# Altium footprint library Connectors THD.PcbLib: 631 footprints (part 20 of 46)
Each footprint in its own frame and in the unit in brackets; x right, y up, seen from the top. Pads: shape width x height; smd on the part's side, far side on the other; paste and mask are expansions set on the pad; w line width, h text height; cw(c..) or ccw(c..) is an arc to the next point about the centre after c.
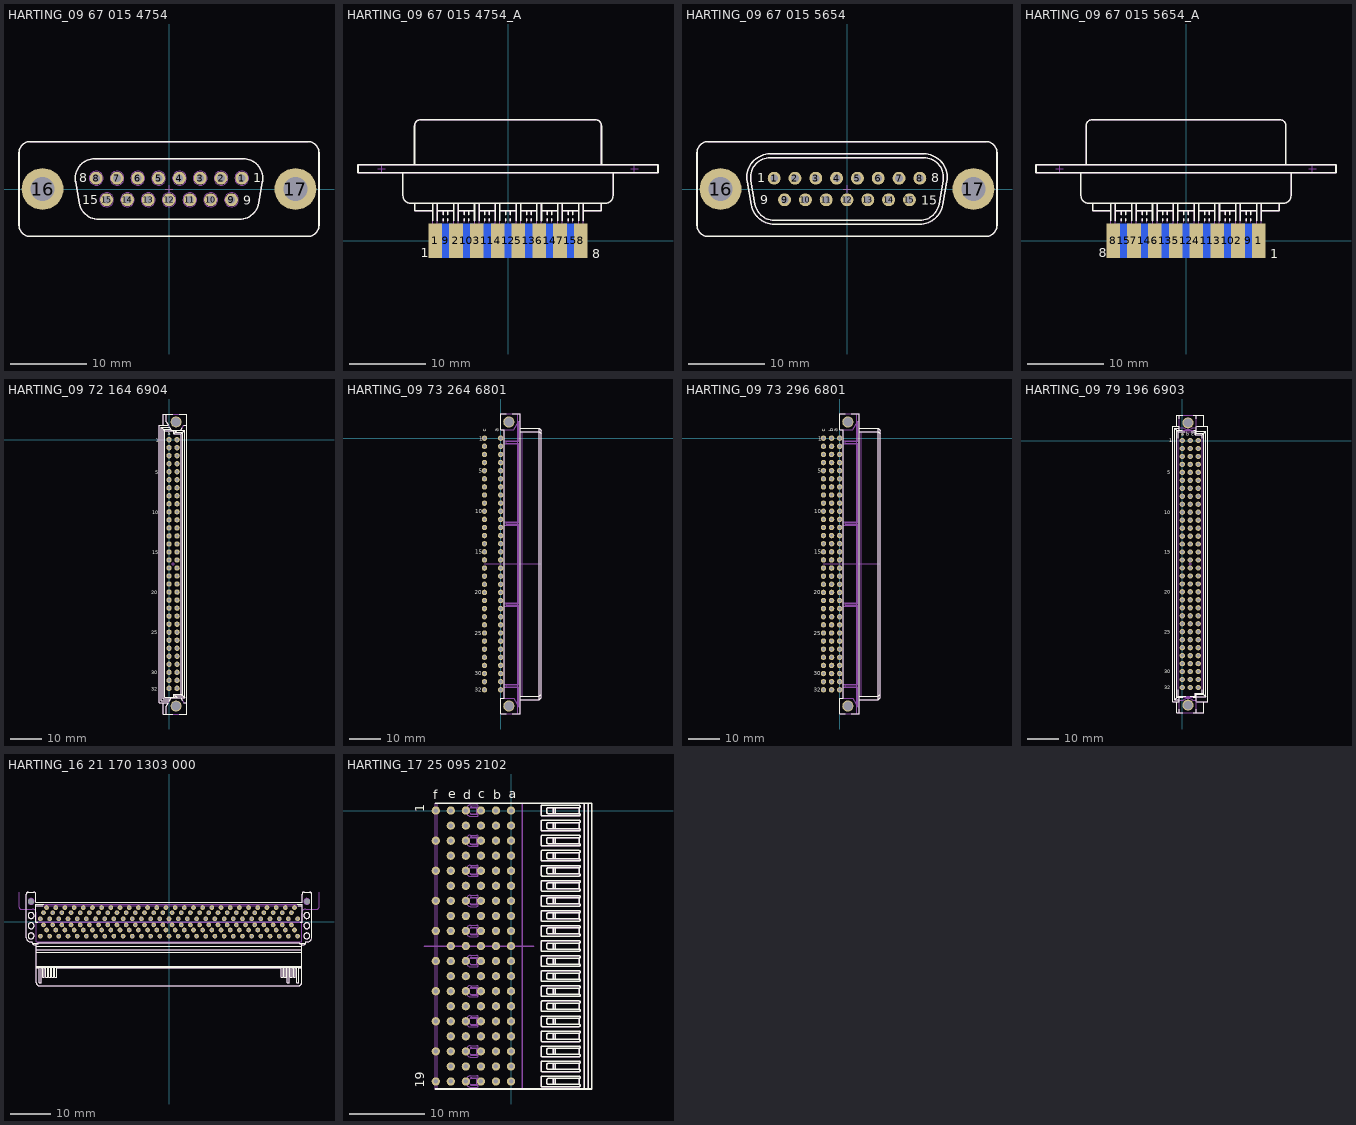
[diagram p19: the footprints below, top view; thin cyan lines are the x and y axes]

## HARTING_09 67 015 4754 [mm] "Straight D-SUB 15 Female Contacts"
height 12
pads (17):
  round 1.7 hole 1: 1(9.59,1.42) 2(6.85,1.42) 3(4.11,1.42) 4(1.37,1.42) 5(-1.37,1.42) 6(-4.11,1.42) 7(-6.85,1.42) 8(-9.59,1.42) 9(8.22,-1.42) 10(5.48,-1.42) 11(2.74,-1.42) 12(0,-1.42) 13(-2.74,-1.42) 14(-5.48,-1.42) 15(-8.22,-1.42)
  round 5.5 hole 3.2: 16(-16.65,0) 17(16.65,0)
Top Overlay:
  lines w0.2: -19.75,-4.75 ccw(c-18.25,-4.75) -18.25,-6.25 18.25,-6.25 ccw(c18.25,-4.75) 19.75,-4.75 19.75,4.75 ccw(c18.25,4.75) 18.25,6.25 -18.25,6.25 ccw(c-18.25,4.75) -19.75,4.75 -19.75,-4.75 ; -12.311,0.949 cw(c-9.75,1.4) -9.75,4 9.75,4 cw(c9.75,1.4) 12.311,0.949 11.817,-1.851 cw(c9.256,-1.4) 9.256,-4 -9.256,-4 cw(c-9.256,-1.4) -11.817,-1.851 -12.311,0.949
  text "9" at 9.8,-2.1 h1.2
  text "1" at 11.085,0.873 h1.2
  text "8" at -11.8,0.9 h1.2
  text "15" at -11.4,-2 h1.2
Mechanical 8:
  lines w0.1: -17.15,0 -16.65,0 ; -16.65,-0.5 -16.65,0 ; -16.65,0.5 -16.65,0 ; -16.15,0 -16.65,0 ; -10.09,1.42 -9.59,1.42 ; -9.59,0.92 -9.59,1.42 ; -9.59,1.92 -9.59,1.42 ; -9.09,1.42 -9.59,1.42 ; -8.72,-1.42 -8.22,-1.42 ; -8.22,-1.92 -8.22,-1.42 ; -8.22,-0.92 -8.22,-1.42 ; -7.72,-1.42 -8.22,-1.42 ; -7.35,1.42 -6.85,1.42 ; -6.85,0.92 -6.85,1.42 ; -6.85,1.92 -6.85,1.42 ; -6.35,1.42 -6.85,1.42 ; -5.98,-1.42 -5.48,-1.42 ; -5.48,-1.92 -5.48,-1.42 ; -5.48,-0.92 -5.48,-1.42 ; -4.98,-1.42 -5.48,-1.42 ; -4.61,1.42 -4.11,1.42 ; -4.11,0.92 -4.11,1.42 ; -4.11,1.92 -4.11,1.42 ; -3.61,1.42 -4.11,1.42 ; -3.24,-1.42 -2.74,-1.42 ; -2.74,-1.92 -2.74,-1.42 ; -2.74,-0.92 -2.74,-1.42 ; -2.24,-1.42 -2.74,-1.42 ; -1.87,1.42 -1.37,1.42 ; -1.37,0.92 -1.37,1.42 ; -1.37,1.92 -1.37,1.42 ; -0.87,1.42 -1.37,1.42 ; -0.5,-1.42 0,-1.42 ; -0.5,0 0,0 ; 0,-1.92 0,-1.42 ; 0,-0.92 0,-1.42 ; 0,-0.5 0,0 ; 0,0.5 0,0 ; 0.5,-1.42 0,-1.42 ; 0.5,0 0,0 ; 0.87,1.42 1.37,1.42 ; 1.37,0.92 1.37,1.42 ; 1.37,1.92 1.37,1.42 ; 1.87,1.42 1.37,1.42 ; 2.24,-1.42 2.74,-1.42 ; 2.74,-1.92 2.74,-1.42 ; 2.74,-0.92 2.74,-1.42 ; 3.24,-1.42 2.74,-1.42 ; 3.61,1.42 4.11,1.42 ; 4.11,0.92 4.11,1.42 ; 4.11,1.92 4.11,1.42 ; 4.61,1.42 4.11,1.42 ; 4.98,-1.42 5.48,-1.42 ; 5.48,-1.92 5.48,-1.42 ; 5.48,-0.92 5.48,-1.42 ; 5.98,-1.42 5.48,-1.42 ; 6.35,1.42 6.85,1.42 ; 6.85,0.92 6.85,1.42 ; 6.85,1.92 6.85,1.42 ; 7.35,1.42 6.85,1.42 ; 7.72,-1.42 8.22,-1.42 ; 8.22,-1.92 8.22,-1.42 ; 8.22,-0.92 8.22,-1.42 ; 8.72,-1.42 8.22,-1.42 ; 9.09,1.42 9.59,1.42 ; 9.59,0.92 9.59,1.42 ; 9.59,1.92 9.59,1.42 ; 10.09,1.42 9.59,1.42 ; 16.15,0 16.65,0 ; 16.65,-0.5 16.65,0 ; 16.65,0.5 16.65,0 ; 17.15,0 16.65,0
Mechanical 14:
  circle w0.1: c-9.59,1.42 r0.92
  circle w0.1: c-6.85,1.42 r0.92
  circle w0.1: c-4.11,1.42 r0.92
  circle w0.1: c-1.37,1.42 r0.92
  circle w0.1: c1.37,1.42 r0.92
  circle w0.1: c4.11,1.42 r0.92
  circle w0.1: c6.85,1.42 r0.92
  circle w0.1: c9.59,1.42 r0.92
  circle w0.1: c8.22,-1.42 r0.92
  circle w0.1: c5.48,-1.42 r0.92
  circle w0.1: c2.74,-1.42 r0.92
  circle w0.1: c0,-1.42 r0.92
  circle w0.1: c-2.74,-1.42 r0.92
  circle w0.1: c-5.48,-1.42 r0.92
  circle w0.1: c-8.22,-1.42 r0.92
  circle w0.1: c-16.65,0 r1.55
  circle w0.1: c16.65,0 r1.55
  circle w0.1: c-9.59,1.42 r0.55
  circle w0.1: c-6.85,1.42 r0.55
  circle w0.1: c-4.11,1.42 r0.55
  circle w0.1: c-1.37,1.42 r0.55
  circle w0.1: c1.37,1.42 r0.55
  circle w0.1: c4.11,1.42 r0.55
  circle w0.1: c6.85,1.42 r0.55
  circle w0.1: c9.59,1.42 r0.55
  circle w0.1: c8.22,-1.42 r0.55
  circle w0.1: c5.48,-1.42 r0.55
  circle w0.1: c2.74,-1.42 r0.55
  circle w0.1: c0,-1.42 r0.55
  circle w0.1: c-2.74,-1.42 r0.55
  circle w0.1: c-5.48,-1.42 r0.55
  circle w0.1: c-8.22,-1.42 r0.55
  lines w0.1: -19.75,-4.75 ccw(c-18.25,-4.75) -18.25,-6.25 18.25,-6.25 ccw(c18.25,-4.75) 19.75,-4.75 19.75,4.75 ccw(c18.25,4.75) 18.25,6.25 -18.25,6.25 ccw(c-18.25,4.75) -19.75,4.75 -19.75,-4.75 ; -12.311,0.949 cw(c-9.75,1.4) -9.75,4 9.75,4 cw(c9.75,1.4) 12.311,0.949 11.817,-1.851 cw(c9.256,-1.4) 9.256,-4 -9.256,-4 cw(c-9.256,-1.4) -11.817,-1.851 -12.311,0.949
  text "15" at -11.4,-2 h1.2
  text "8" at -11.8,0.9 h1.2
  text "1" at 11.085,0.873 h1.2
  text "9" at 9.8,-2.1 h1.2
3D body: height 12, standoff -6, extent -19.75,-6.25 19.75,6.25

## HARTING_09 67 015 4754_A [mm] "PCB Edge Mounting Footprint For Straight D-SUB 15 Female Contacts"
height 6
pads (15):
  rect 1.8x4.5 smd paste-2.26: 1(-9.59,0) 2(-6.85,0) 3(-4.11,0) 4(-1.37,0) 5(1.37,0) 6(4.11,0) 7(6.85,0) 8(9.59,0)
  rect 1.8x4.5 smd far side paste-2.26: 9(-8.22,0) 10(-5.48,0) 11(-2.74,0) 12(0,0) 13(2.74,0) 14(5.48,0) 15(8.22,0)
Top Overlay:
  lines w0.2: -13.833,8.928 -13.833,5.928 ccw(c-12.833,5.928) -12.833,4.928 12.833,4.928 ccw(c12.833,5.928) 13.833,5.928 13.833,8.928 ; -12.311,10.028 -12.311,15.128 cw(c-11.511,15.128) -11.511,15.928 11.511,15.928 cw(c11.511,15.128) 12.311,15.128 12.311,10.028 ; -12.3,4.928 -12.3,3.928 -9.89,3.928 ; -9.89,2.65 -9.89,4.928 ; -9.29,2.65 -9.29,4.928 ; -9.29,3.928 -7.15,3.928 ; -8.52,2.65 -8.52,2.928 ; -8.52,3.428 -8.52,3.928 ; -7.92,2.65 -7.92,2.928 ; -7.92,3.428 -7.92,3.928 ; -7.15,2.65 -7.15,4.928 ; -6.55,2.65 -6.55,4.928 ; -6.55,3.928 -4.41,3.928 ; -5.78,2.65 -5.78,2.928 ; -5.78,3.428 -5.78,3.928 ; -5.18,2.65 -5.18,2.928 ; -5.18,3.428 -5.18,3.928 ; -4.41,2.65 -4.41,4.928 ; -3.81,2.65 -3.81,4.928 ; -3.81,3.928 -1.67,3.928 ; -3.04,2.65 -3.04,2.928 ; -3.04,3.428 -3.04,3.928 ; -2.44,2.65 -2.44,2.928 ; -2.44,3.428 -2.44,3.928 ; -1.67,2.65 -1.67,4.928 ; -1.07,2.65 -1.07,4.928 ; -1.07,3.928 1.07,3.928 ; -0.3,2.65 -0.3,2.928 ; -0.3,3.428 -0.3,3.928 ; 0.3,2.65 0.3,2.928 ; 0.3,3.428 0.3,3.928 ; 1.07,2.65 1.07,4.928 ; 1.67,2.65 1.67,4.928 ; 1.67,3.928 3.81,3.928 ; 2.44,2.65 2.44,2.928 ; 2.44,3.428 2.44,3.928 ; 3.04,2.65 3.04,2.928 ; 3.04,3.428 3.04,3.928 ; 3.81,2.65 3.81,4.928 ; 4.41,2.65 4.41,4.928 ; 4.41,3.928 6.55,3.928 ; 5.18,2.65 5.18,2.928 ; 5.18,3.428 5.18,3.928 ; 5.78,2.65 5.78,2.928 ; 5.78,3.428 5.78,3.928 ; 6.55,2.65 6.55,4.928 ; 7.15,2.65 7.15,4.928 ; 7.15,3.928 9.29,3.928 ; 7.92,2.65 7.92,2.928 ; 7.92,3.428 7.92,3.928 ; 8.52,2.65 8.52,2.928 ; 8.52,3.428 8.52,3.928 ; 9.29,2.65 9.29,4.928 ; 9.89,2.65 9.89,4.928 ; 9.89,3.928 12.3,3.928 12.3,4.928 ; -19.75,8.928 19.75,8.928 19.75,10.028 -19.75,10.028 -19.75,8.928
  text "8" at 11.1,-2.3 h1.2
  text "1" at -11.5,-2.2 h1.2
Bottom Overlay:
  lines w0.2: -13.833,8.928 -13.833,5.928 ccw(c-12.833,5.928) -12.833,4.928 12.833,4.928 ccw(c12.833,5.928) 13.833,5.928 13.833,8.928 ; -12.311,10.028 -12.311,15.128 cw(c-11.511,15.128) -11.511,15.928 11.511,15.928 cw(c11.511,15.128) 12.311,15.128 12.311,10.028 ; -12.3,4.928 -12.3,3.928 -8.52,3.928 ; -9.89,2.65 -9.89,2.928 ; -9.89,3.428 -9.89,3.928 ; -9.29,2.65 -9.29,2.928 ; -9.29,3.428 -9.29,3.928 ; -8.52,2.65 -8.52,4.928 ; -7.92,2.65 -7.92,4.928 ; -7.92,3.928 -5.78,3.928 ; -7.15,2.65 -7.15,2.928 ; -7.15,3.428 -7.15,3.928 ; -6.55,2.65 -6.55,2.928 ; -6.55,3.428 -6.55,3.928 ; -5.78,2.65 -5.78,4.928 ; -5.18,2.65 -5.18,4.928 ; -5.18,3.928 -3.04,3.928 ; -4.41,2.65 -4.41,2.928 ; -4.41,3.428 -4.41,3.928 ; -3.81,2.65 -3.81,2.928 ; -3.81,3.428 -3.81,3.928 ; -3.04,2.65 -3.04,4.928 ; -2.44,2.65 -2.44,4.928 ; -2.44,3.928 -0.3,3.928 ; -1.67,2.65 -1.67,2.928 ; -1.67,3.428 -1.67,3.928 ; -1.07,2.65 -1.07,2.928 ; -1.07,3.428 -1.07,3.928 ; -0.3,2.65 -0.3,4.928 ; 0.3,2.65 0.3,4.928 ; 0.3,3.928 2.44,3.928 ; 1.07,2.65 1.07,2.928 ; 1.07,3.428 1.07,3.928 ; 1.67,2.65 1.67,2.928 ; 1.67,3.428 1.67,3.928 ; 2.44,2.65 2.44,4.928 ; 3.04,2.65 3.04,4.928 ; 3.04,3.928 5.18,3.928 ; 3.81,2.65 3.81,2.928 ; 3.81,3.428 3.81,3.928 ; 4.41,2.65 4.41,2.928 ; 4.41,3.428 4.41,3.928 ; 5.18,2.65 5.18,4.928 ; 5.78,2.65 5.78,4.928 ; 5.78,3.928 7.92,3.928 ; 6.55,2.65 6.55,2.928 ; 6.55,3.428 6.55,3.928 ; 7.15,2.65 7.15,2.928 ; 7.15,3.428 7.15,3.928 ; 7.92,2.65 7.92,4.928 ; 8.52,2.65 8.52,4.928 ; 8.52,3.928 12.3,3.928 12.3,4.928 ; 9.29,2.65 9.29,2.928 ; 9.29,3.428 9.29,3.928 ; 9.89,2.65 9.89,2.928 ; 9.89,3.428 9.89,3.928 ; -19.75,8.928 19.75,8.928 19.75,10.028 -19.75,10.028 -19.75,8.928
  text "15" at 11.3,-2.2 h1.2
  text "9" at -9.6,-2.2 h1.2
Mechanical 8:
  lines w0.1: -17.15,9.478 -16.65,9.478 ; -16.65,8.928 -16.65,9.478 ; -16.65,10.028 -16.65,9.478 ; -16.15,9.478 -16.65,9.478 ; -10.09,0 -9.59,0 ; -9.59,-0.5 -9.59,0 ; -9.59,0.5 -9.59,0 ; -9.09,0 -9.59,0 ; -8.72,0 -8.22,0 ; -8.22,-0.5 -8.22,0 ; -8.22,0.5 -8.22,0 ; -7.72,0 -8.22,0 ; -7.35,0 -6.85,0 ; -6.85,-0.5 -6.85,0 ; -6.85,0.5 -6.85,0 ; -6.35,0 -6.85,0 ; -5.98,0 -5.48,0 ; -5.48,-0.5 -5.48,0 ; -5.48,0.5 -5.48,0 ; -4.98,0 -5.48,0 ; -4.61,0 -4.11,0 ; -4.11,-0.5 -4.11,0 ; -4.11,0.5 -4.11,0 ; -3.61,0 -4.11,0 ; -3.24,0 -2.74,0 ; -2.74,-0.5 -2.74,0 ; -2.74,0.5 -2.74,0 ; -2.24,0 -2.74,0 ; -1.87,0 -1.37,0 ; -1.37,-0.5 -1.37,0 ; -1.37,0.5 -1.37,0 ; -0.87,0 -1.37,0 ; -0.5,0 0,0 ; 0,-0.5 0,0 ; 0,0.5 0,0 ; 0.5,0 0,0 ; 0.87,0 1.37,0 ; 1.37,-0.5 1.37,0 ; 1.37,0.5 1.37,0 ; 1.87,0 1.37,0 ; 2.24,0 2.74,0 ; 2.74,-0.5 2.74,0 ; 2.74,0.5 2.74,0 ; 3.24,0 2.74,0 ; 3.61,0 4.11,0 ; 4.11,-0.5 4.11,0 ; 4.11,0.5 4.11,0 ; 4.61,0 4.11,0 ; 4.98,0 5.48,0 ; 5.48,-0.5 5.48,0 ; 5.48,0.5 5.48,0 ; 5.98,0 5.48,0 ; 6.35,0 6.85,0 ; 6.85,-0.5 6.85,0 ; 6.85,0.5 6.85,0 ; 7.35,0 6.85,0 ; 7.72,0 8.22,0 ; 8.22,-0.5 8.22,0 ; 8.22,0.5 8.22,0 ; 8.72,0 8.22,0 ; 9.09,0 9.59,0 ; 9.59,-0.5 9.59,0 ; 9.59,0.5 9.59,0 ; 10.09,0 9.59,0 ; 16.15,9.478 16.65,9.478 ; 16.65,8.928 16.65,9.478 ; 16.65,10.028 16.65,9.478 ; 17.15,9.478 16.65,9.478
Mechanical 14:
  drawing of 155 lines, arcs and shapes, not listed
  text "8" at 11.1,-2.3 h1.2
  text "1" at -11.5,-2.2 h1.2
3D body: height 5.45, standoff -7.05, extent -19.75,-2.072 19.75,15.928

## HARTING_09 67 015 5654 [mm] "Straight D-SUB 15 Male Contacts"
height 12
pads (17):
  round 1.7 hole 1: 1(-9.59,1.42) 2(-6.85,1.42) 3(-4.11,1.42) 4(-1.37,1.42) 5(1.37,1.42) 6(4.11,1.42) 7(6.85,1.42) 8(9.59,1.42) 9(-8.22,-1.42) 10(-5.48,-1.42) 11(-2.74,-1.42) 12(0,-1.42) 13(2.74,-1.42) 14(5.48,-1.42) 15(8.22,-1.42)
  round 5.5 hole 3.2: 16(-16.65,0) 17(16.65,0)
Top Overlay:
  lines w0.2: -19.75,-4.75 ccw(c-18.25,-4.75) -18.25,-6.25 18.25,-6.25 ccw(c18.25,-4.75) 19.75,-4.75 19.75,4.75 ccw(c18.25,4.75) 18.25,6.25 -18.25,6.25 ccw(c-18.25,4.75) -19.75,4.75 -19.75,-4.75 ; -13.153,0.987 cw(c-10.1,1.525) -10.1,4.625 10.1,4.625 cw(c10.1,1.525) 13.153,0.987 12.615,-2.063 cw(c9.562,-1.525) 9.562,-4.625 -9.562,-4.625 cw(c-9.562,-1.525) -12.615,-2.063 -13.153,0.987 ; -12.661,1.074 cw(c-10.1,1.525) -10.1,4.125 10.1,4.125 cw(c10.1,1.525) 12.661,1.074 12.123,-1.976 cw(c9.562,-1.525) 9.562,-4.125 -9.562,-4.125 cw(c-9.562,-1.525) -12.123,-1.976 -12.661,1.074
  text "15" at 9.8,-2.1 h1.2
  text "8" at 11.085,0.873 h1.2
  text "1" at -11.8,0.9 h1.2
  text "9" at -11.4,-2 h1.2
Mechanical 8:
  lines w0.1: -17.15,0 -16.65,0 ; -16.65,-0.5 -16.65,0 ; -16.65,0.5 -16.65,0 ; -16.15,0 -16.65,0 ; -10.09,1.42 -9.59,1.42 ; -9.59,0.92 -9.59,1.42 ; -9.59,1.92 -9.59,1.42 ; -9.09,1.42 -9.59,1.42 ; -8.72,-1.42 -8.22,-1.42 ; -8.22,-1.92 -8.22,-1.42 ; -8.22,-0.92 -8.22,-1.42 ; -7.72,-1.42 -8.22,-1.42 ; -7.35,1.42 -6.85,1.42 ; -6.85,0.92 -6.85,1.42 ; -6.85,1.92 -6.85,1.42 ; -6.35,1.42 -6.85,1.42 ; -5.98,-1.42 -5.48,-1.42 ; -5.48,-1.92 -5.48,-1.42 ; -5.48,-0.92 -5.48,-1.42 ; -4.98,-1.42 -5.48,-1.42 ; -4.61,1.42 -4.11,1.42 ; -4.11,0.92 -4.11,1.42 ; -4.11,1.92 -4.11,1.42 ; -3.61,1.42 -4.11,1.42 ; -3.24,-1.42 -2.74,-1.42 ; -2.74,-1.92 -2.74,-1.42 ; -2.74,-0.92 -2.74,-1.42 ; -2.24,-1.42 -2.74,-1.42 ; -1.87,1.42 -1.37,1.42 ; -1.37,0.92 -1.37,1.42 ; -1.37,1.92 -1.37,1.42 ; -0.87,1.42 -1.37,1.42 ; -0.5,-1.42 0,-1.42 ; -0.5,0 0,0 ; 0,-1.92 0,-1.42 ; 0,-0.92 0,-1.42 ; 0,-0.5 0,0 ; 0,0.5 0,0 ; 0.5,-1.42 0,-1.42 ; 0.5,0 0,0 ; 0.87,1.42 1.37,1.42 ; 1.37,0.92 1.37,1.42 ; 1.37,1.92 1.37,1.42 ; 1.87,1.42 1.37,1.42 ; 2.24,-1.42 2.74,-1.42 ; 2.74,-1.92 2.74,-1.42 ; 2.74,-0.92 2.74,-1.42 ; 3.24,-1.42 2.74,-1.42 ; 3.61,1.42 4.11,1.42 ; 4.11,0.92 4.11,1.42 ; 4.11,1.92 4.11,1.42 ; 4.61,1.42 4.11,1.42 ; 4.98,-1.42 5.48,-1.42 ; 5.48,-1.92 5.48,-1.42 ; 5.48,-0.92 5.48,-1.42 ; 5.98,-1.42 5.48,-1.42 ; 6.35,1.42 6.85,1.42 ; 6.85,0.92 6.85,1.42 ; 6.85,1.92 6.85,1.42 ; 7.35,1.42 6.85,1.42 ; 7.72,-1.42 8.22,-1.42 ; 8.22,-1.92 8.22,-1.42 ; 8.22,-0.92 8.22,-1.42 ; 8.72,-1.42 8.22,-1.42 ; 9.09,1.42 9.59,1.42 ; 9.59,0.92 9.59,1.42 ; 9.59,1.92 9.59,1.42 ; 10.09,1.42 9.59,1.42 ; 16.15,0 16.65,0 ; 16.65,-0.5 16.65,0 ; 16.65,0.5 16.65,0 ; 17.15,0 16.65,0
Mechanical 14:
  circle w0.1: c-8.22,-1.42 r0.55
  circle w0.1: c-5.48,-1.42 r0.55
  circle w0.1: c-2.74,-1.42 r0.55
  circle w0.1: c0,-1.42 r0.55
  circle w0.1: c2.74,-1.42 r0.55
  circle w0.1: c5.48,-1.42 r0.55
  circle w0.1: c8.22,-1.42 r0.55
  circle w0.1: c9.59,1.42 r0.55
  circle w0.1: c6.85,1.42 r0.55
  circle w0.1: c4.11,1.42 r0.55
  circle w0.1: c1.37,1.42 r0.55
  circle w0.1: c-1.37,1.42 r0.55
  circle w0.1: c-4.11,1.42 r0.55
  circle w0.1: c-6.85,1.42 r0.55
  circle w0.1: c-9.59,1.42 r0.55
  circle w0.1: c16.65,0 r1.55
  circle w0.1: c-16.65,0 r1.55
  lines w0.1: -19.75,-4.75 ccw(c-18.25,-4.75) -18.25,-6.25 18.25,-6.25 ccw(c18.25,-4.75) 19.75,-4.75 19.75,4.75 ccw(c18.25,4.75) 18.25,6.25 -18.25,6.25 ccw(c-18.25,4.75) -19.75,4.75 -19.75,-4.75 ; -13.153,0.987 cw(c-10.1,1.525) -10.1,4.625 10.1,4.625 cw(c10.1,1.525) 13.153,0.987 12.615,-2.063 cw(c9.562,-1.525) 9.562,-4.625 -9.562,-4.625 cw(c-9.562,-1.525) -12.615,-2.063 -13.153,0.987 ; -12.661,1.074 cw(c-10.1,1.525) -10.1,4.125 10.1,4.125 cw(c10.1,1.525) 12.661,1.074 12.123,-1.976 cw(c9.562,-1.525) 9.562,-4.125 -9.562,-4.125 cw(c-9.562,-1.525) -12.123,-1.976 -12.661,1.074
  text "9" at -11.4,-2 h1.2
  text "1" at -11.8,0.9 h1.2
  text "8" at 11.085,0.873 h1.2
  text "15" at 9.8,-2.1 h1.2
3D body: height 12, standoff -6, extent -19.75,-6.25 19.75,6.25

## HARTING_09 67 015 5654_A [mm] "PCB Edge Mounting Footprint For Straight D-SUB 15 Male Contacts"
height 6
pads (15):
  rect 1.8x4.5 smd paste-2.26: 1(9.59,0) 2(6.85,0) 3(4.11,0) 4(1.37,0) 5(-1.37,0) 6(-4.11,0) 7(-6.85,0) 8(-9.59,0)
  rect 1.8x4.5 smd far side paste-2.26: 9(8.22,0) 10(5.48,0) 11(2.74,0) 12(0,0) 13(-2.74,0) 14(-5.48,0) 15(-8.22,0)
Top Overlay:
  lines w0.2: -13.833,8.928 -13.833,5.928 ccw(c-12.833,5.928) -12.833,4.928 12.833,4.928 ccw(c12.833,5.928) 13.833,5.928 13.833,8.928 ; -13.153,10.028 -13.153,15.128 cw(c-12.353,15.128) -12.353,15.928 12.353,15.928 cw(c12.353,15.128) 13.153,15.128 13.153,10.028 ; -12.3,4.928 -12.3,3.928 -9.89,3.928 ; -9.89,2.65 -9.89,4.928 ; -9.29,2.65 -9.29,4.928 ; -9.29,3.928 -7.15,3.928 ; -8.52,2.65 -8.52,2.928 ; -8.52,3.428 -8.52,3.928 ; -7.92,2.65 -7.92,2.928 ; -7.92,3.428 -7.92,3.928 ; -7.15,2.65 -7.15,4.928 ; -6.55,2.65 -6.55,4.928 ; -6.55,3.928 -4.41,3.928 ; -5.78,2.65 -5.78,2.928 ; -5.78,3.428 -5.78,3.928 ; -5.18,2.65 -5.18,2.928 ; -5.18,3.428 -5.18,3.928 ; -4.41,2.65 -4.41,4.928 ; -3.81,2.65 -3.81,4.928 ; -3.81,3.928 -1.67,3.928 ; -3.04,2.65 -3.04,2.928 ; -3.04,3.428 -3.04,3.928 ; -2.44,2.65 -2.44,2.928 ; -2.44,3.428 -2.44,3.928 ; -1.67,2.65 -1.67,4.928 ; -1.07,2.65 -1.07,4.928 ; -1.07,3.928 1.07,3.928 ; -0.3,2.65 -0.3,2.928 ; -0.3,3.428 -0.3,3.928 ; 0.3,2.65 0.3,2.928 ; 0.3,3.428 0.3,3.928 ; 1.07,2.65 1.07,4.928 ; 1.67,2.65 1.67,4.928 ; 1.67,3.928 3.81,3.928 ; 2.44,2.65 2.44,2.928 ; 2.44,3.428 2.44,3.928 ; 3.04,2.65 3.04,2.928 ; 3.04,3.428 3.04,3.928 ; 3.81,2.65 3.81,4.928 ; 4.41,2.65 4.41,4.928 ; 4.41,3.928 6.55,3.928 ; 5.18,2.65 5.18,2.928 ; 5.18,3.428 5.18,3.928 ; 5.78,2.65 5.78,2.928 ; 5.78,3.428 5.78,3.928 ; 6.55,2.65 6.55,4.928 ; 7.15,2.65 7.15,4.928 ; 7.15,3.928 9.29,3.928 ; 7.92,2.65 7.92,2.928 ; 7.92,3.428 7.92,3.928 ; 8.52,2.65 8.52,2.928 ; 8.52,3.428 8.52,3.928 ; 9.29,2.65 9.29,4.928 ; 9.89,2.65 9.89,4.928 ; 9.89,3.928 12.3,3.928 12.3,4.928 ; -19.75,8.928 19.75,8.928 19.75,10.028 -19.75,10.028 -19.75,8.928
  text "1" at 11.1,-2.3 h1.2
  text "8" at -11.5,-2.2 h1.2
Bottom Overlay:
  lines w0.2: -13.833,8.928 -13.833,5.928 ccw(c-12.833,5.928) -12.833,4.928 12.833,4.928 ccw(c12.833,5.928) 13.833,5.928 13.833,8.928 ; -13.153,10.028 -13.153,15.128 cw(c-12.353,15.128) -12.353,15.928 12.353,15.928 cw(c12.353,15.128) 13.153,15.128 13.153,10.028 ; -12.3,4.928 -12.3,3.928 -8.52,3.928 ; -9.89,2.65 -9.89,2.928 ; -9.89,3.428 -9.89,3.928 ; -9.29,2.65 -9.29,2.928 ; -9.29,3.428 -9.29,3.928 ; -8.52,2.65 -8.52,4.928 ; -7.92,2.65 -7.92,4.928 ; -7.92,3.928 -5.78,3.928 ; -7.15,2.65 -7.15,2.928 ; -7.15,3.428 -7.15,3.928 ; -6.55,2.65 -6.55,2.928 ; -6.55,3.428 -6.55,3.928 ; -5.78,2.65 -5.78,4.928 ; -5.18,2.65 -5.18,4.928 ; -5.18,3.928 -3.04,3.928 ; -4.41,2.65 -4.41,2.928 ; -4.41,3.428 -4.41,3.928 ; -3.81,2.65 -3.81,2.928 ; -3.81,3.428 -3.81,3.928 ; -3.04,2.65 -3.04,4.928 ; -2.44,2.65 -2.44,4.928 ; -2.44,3.928 -0.3,3.928 ; -1.67,2.65 -1.67,2.928 ; -1.67,3.428 -1.67,3.928 ; -1.07,2.65 -1.07,2.928 ; -1.07,3.428 -1.07,3.928 ; -0.3,2.65 -0.3,4.928 ; 0.3,2.65 0.3,4.928 ; 0.3,3.928 2.44,3.928 ; 1.07,2.65 1.07,2.928 ; 1.07,3.428 1.07,3.928 ; 1.67,2.65 1.67,2.928 ; 1.67,3.428 1.67,3.928 ; 2.44,2.65 2.44,4.928 ; 3.04,2.65 3.04,4.928 ; 3.04,3.928 5.18,3.928 ; 3.81,2.65 3.81,2.928 ; 3.81,3.428 3.81,3.928 ; 4.41,2.65 4.41,2.928 ; 4.41,3.428 4.41,3.928 ; 5.18,2.65 5.18,4.928 ; 5.78,2.65 5.78,4.928 ; 5.78,3.928 7.92,3.928 ; 6.55,2.65 6.55,2.928 ; 6.55,3.428 6.55,3.928 ; 7.15,2.65 7.15,2.928 ; 7.15,3.428 7.15,3.928 ; 7.92,2.65 7.92,4.928 ; 8.52,2.65 8.52,4.928 ; 8.52,3.928 12.3,3.928 12.3,4.928 ; 9.29,2.65 9.29,2.928 ; 9.29,3.428 9.29,3.928 ; 9.89,2.65 9.89,2.928 ; 9.89,3.428 9.89,3.928 ; -19.75,8.928 19.75,8.928 19.75,10.028 -19.75,10.028 -19.75,8.928
  text "9" at 10.4,-2.2 h1.2
  text "15" at -9.6,-2.2 h1.2
Mechanical 8:
  lines w0.1: -17.15,9.478 -16.65,9.478 ; -16.65,8.928 -16.65,9.478 ; -16.65,10.028 -16.65,9.478 ; -16.15,9.478 -16.65,9.478 ; -10.09,0 -9.59,0 ; -9.59,-0.5 -9.59,0 ; -9.59,0.5 -9.59,0 ; -9.09,0 -9.59,0 ; -8.72,0 -8.22,0 ; -8.22,-0.5 -8.22,0 ; -8.22,0.5 -8.22,0 ; -7.72,0 -8.22,0 ; -7.35,0 -6.85,0 ; -6.85,-0.5 -6.85,0 ; -6.85,0.5 -6.85,0 ; -6.35,0 -6.85,0 ; -5.98,0 -5.48,0 ; -5.48,-0.5 -5.48,0 ; -5.48,0.5 -5.48,0 ; -4.98,0 -5.48,0 ; -4.61,0 -4.11,0 ; -4.11,-0.5 -4.11,0 ; -4.11,0.5 -4.11,0 ; -3.61,0 -4.11,0 ; -3.24,0 -2.74,0 ; -2.74,-0.5 -2.74,0 ; -2.74,0.5 -2.74,0 ; -2.24,0 -2.74,0 ; -1.87,0 -1.37,0 ; -1.37,-0.5 -1.37,0 ; -1.37,0.5 -1.37,0 ; -0.87,0 -1.37,0 ; -0.5,0 0,0 ; 0,-0.5 0,0 ; 0,0.5 0,0 ; 0.5,0 0,0 ; 0.87,0 1.37,0 ; 1.37,-0.5 1.37,0 ; 1.37,0.5 1.37,0 ; 1.87,0 1.37,0 ; 2.24,0 2.74,0 ; 2.74,-0.5 2.74,0 ; 2.74,0.5 2.74,0 ; 3.24,0 2.74,0 ; 3.61,0 4.11,0 ; 4.11,-0.5 4.11,0 ; 4.11,0.5 4.11,0 ; 4.61,0 4.11,0 ; 4.98,0 5.48,0 ; 5.48,-0.5 5.48,0 ; 5.48,0.5 5.48,0 ; 5.98,0 5.48,0 ; 6.35,0 6.85,0 ; 6.85,-0.5 6.85,0 ; 6.85,0.5 6.85,0 ; 7.35,0 6.85,0 ; 7.72,0 8.22,0 ; 8.22,-0.5 8.22,0 ; 8.22,0.5 8.22,0 ; 8.72,0 8.22,0 ; 9.09,0 9.59,0 ; 9.59,-0.5 9.59,0 ; 9.59,0.5 9.59,0 ; 10.09,0 9.59,0 ; 16.15,9.478 16.65,9.478 ; 16.65,8.928 16.65,9.478 ; 16.65,10.028 16.65,9.478 ; 17.15,9.478 16.65,9.478
Mechanical 14:
  drawing of 155 lines, arcs and shapes, not listed
  text "1" at 11.1,-2.3 h1.2
  text "8" at -11.5,-2.2 h1.2
3D body: height 5.45, standoff -7.05, extent -19.75,-2.072 19.75,15.928

## HARTING_09 72 164 6904 [mm] "DIN 41612, Type Q, Thru-Hole Press-in; Rows a+b, 64 Position, Straight Male Connector"
height 11.6
pads (66):
  round 1.7 hole 1: a1(0,0) a2(0,-2.54) a3(0,-5.08) a4(0,-7.62) a5(0,-10.16) a6(0,-12.7) a7(0,-15.24) a8(0,-17.78) a9(0,-20.32) a10(0,-22.86) a11(0,-25.4) a12(0,-27.94) a13(0,-30.48) a14(0,-33.02) a15(0,-35.56) a16(0,-38.1) a17(0,-40.64) a18(0,-43.18) a19(0,-45.72) a20(0,-48.26) a21(0,-50.8) a22(0,-53.34) a23(0,-55.88) a24(0,-58.42) a25(0,-60.96) a26(0,-63.5) a27(0,-66.04) a28(0,-68.58) a29(0,-71.12) a30(0,-73.66) a31(0,-76.2) a32(0,-78.74) b1(2.54,0) b2(2.54,-2.54) b3(2.54,-5.08) b4(2.54,-7.62) b5(2.54,-10.16) b6(2.54,-12.7) b7(2.54,-15.24) b8(2.54,-17.78) b9(2.54,-20.32) b10(2.54,-22.86) b11(2.54,-25.4) b12(2.54,-27.94) b13(2.54,-30.48) b14(2.54,-33.02) b15(2.54,-35.56) b16(2.54,-38.1) b17(2.54,-40.64) b18(2.54,-43.18) b19(2.54,-45.72) b20(2.54,-48.26) b21(2.54,-50.8) b22(2.54,-53.34) b23(2.54,-55.88) b24(2.54,-58.42) b25(2.54,-60.96) b26(2.54,-63.5) b27(2.54,-66.04) b28(2.54,-68.58) b29(2.54,-71.12) b30(2.54,-73.66) b31(2.54,-76.2) b32(2.54,-78.74)
  round 3.5 / inner round 3.5 / far side round 5.1 hole 2.8: MTG1(2.24,5.63) MTG2(2.24,-84.37)
Top Overlay:
  lines w0.2: -1.83,-83.32 -1.83,-86.87 1.22,-86.87 ; -1.83,4.58 -1.83,8.13 1.22,8.13 ; -0.81,-86.87 -0.81,-84.37 -0.327,-83.534 ; -0.81,8.13 -0.81,5.63 -0.327,4.794 ; -0.247,4.58 -3.03,4.58 -3.03,-83.32 -0.204,-83.32 ; 0.184,3.88 -2.48,3.88 ; 0.2,-82.62 -2.48,-82.62 -2.48,3.88 ; 0.232,-82.565 0.749,-81.67 3.731,-81.67 ; 0.232,3.825 0.749,2.93 3.731,2.93 ; 0.576,-81.97 -1.83,-81.97 -1.83,3.23 0.576,3.23 ; 1.67,-81.67 1.52,-81.52 ; 1.67,2.93 1.52,2.78 ; 1.97,-81.67 1.97,-81.02 4.37,-81.02 4.37,2.28 1.97,2.28 1.97,2.93 ; 2.62,-81.67 1.52,-80.57 ; 2.62,2.93 1.52,1.83 ; 3.26,-86.87 5.57,-86.87 5.57,8.13 3.26,8.13 ; 4.248,-82.565 3.731,-81.67 ; 4.248,3.825 3.731,2.93 ; 4.728,-83.32 5.57,-83.323 ; 4.727,4.58 5.57,4.58 ; -2.48,3.88 -1.38,2.78 ; -1.38,2.78 -1.38,-81.52 1.52,-81.52 ; -1.38,2.78 1.52,2.78 ; 1.52,-81.52 1.52,-80.57 ; 1.52,-80.57 3.92,-80.57 ; 1.52,1.83 1.52,2.78 ; 1.52,1.83 3.92,1.83 ; 3.731,-81.67 5.02,-81.67 ; 3.731,2.93 5.02,2.93 ; 3.92,-80.57 5.02,-81.67 ; 3.92,-80.57 3.92,1.83 ; 3.92,1.83 5.02,2.93 ; 5.02,-81.67 5.02,2.93
  text "1" at -4.175,-0.75 h1.2
  text "15" at -5.3,-36.26 h1.2
  text "20" at -5.6,-48.96 h1.2
  text "25" at -5.6,-61.66 h1.2
  text "30" at -5.6,-74.36 h1.2
  text "10" at -5.3,-23.56 h1.2
  text "5" at -4.375,-10.91 h1.2
  text "32" at -5.6,-79.44 h1.2
  text "a" at -0.451,1.385 h1.2
Mechanical 8:
  lines w0.1: -0.5,-78.74 0,-78.74 ; -0.5,0 0,0 ; 0,-79.24 0,-78.74 ; 0,-78.24 0,-78.74 ; 0,-0.5 0,0 ; 0,0.5 0,0 ; 0.5,-78.74 0,-78.74 ; 0.5,0 0,0 ; 0.77,-39.37 1.27,-39.37 ; 1.27,-39.87 1.27,-39.37 ; 1.27,-38.87 1.27,-39.37 ; 1.77,-39.37 1.27,-39.37 ; 2.04,-78.74 2.54,-78.74 ; 2.04,0 2.54,0 ; 2.54,-79.24 2.54,-78.74 ; 2.54,-78.24 2.54,-78.74 ; 2.54,-0.5 2.54,0 ; 2.54,0.5 2.54,0 ; 3.04,-78.74 2.54,-78.74 ; 3.04,0 2.54,0